# Altium footprint library IoWLabs.PcbLib: 55 footprints (part 3 of 4)
Each footprint in its own frame and in the unit in brackets; x right, y up, seen from the top. Pads: shape width x height; smd on the part's side, far side on the other; paste and mask are expansions set on the pad; w line width, h text height; cw(c..) or ccw(c..) is an arc to the next point about the centre after c.
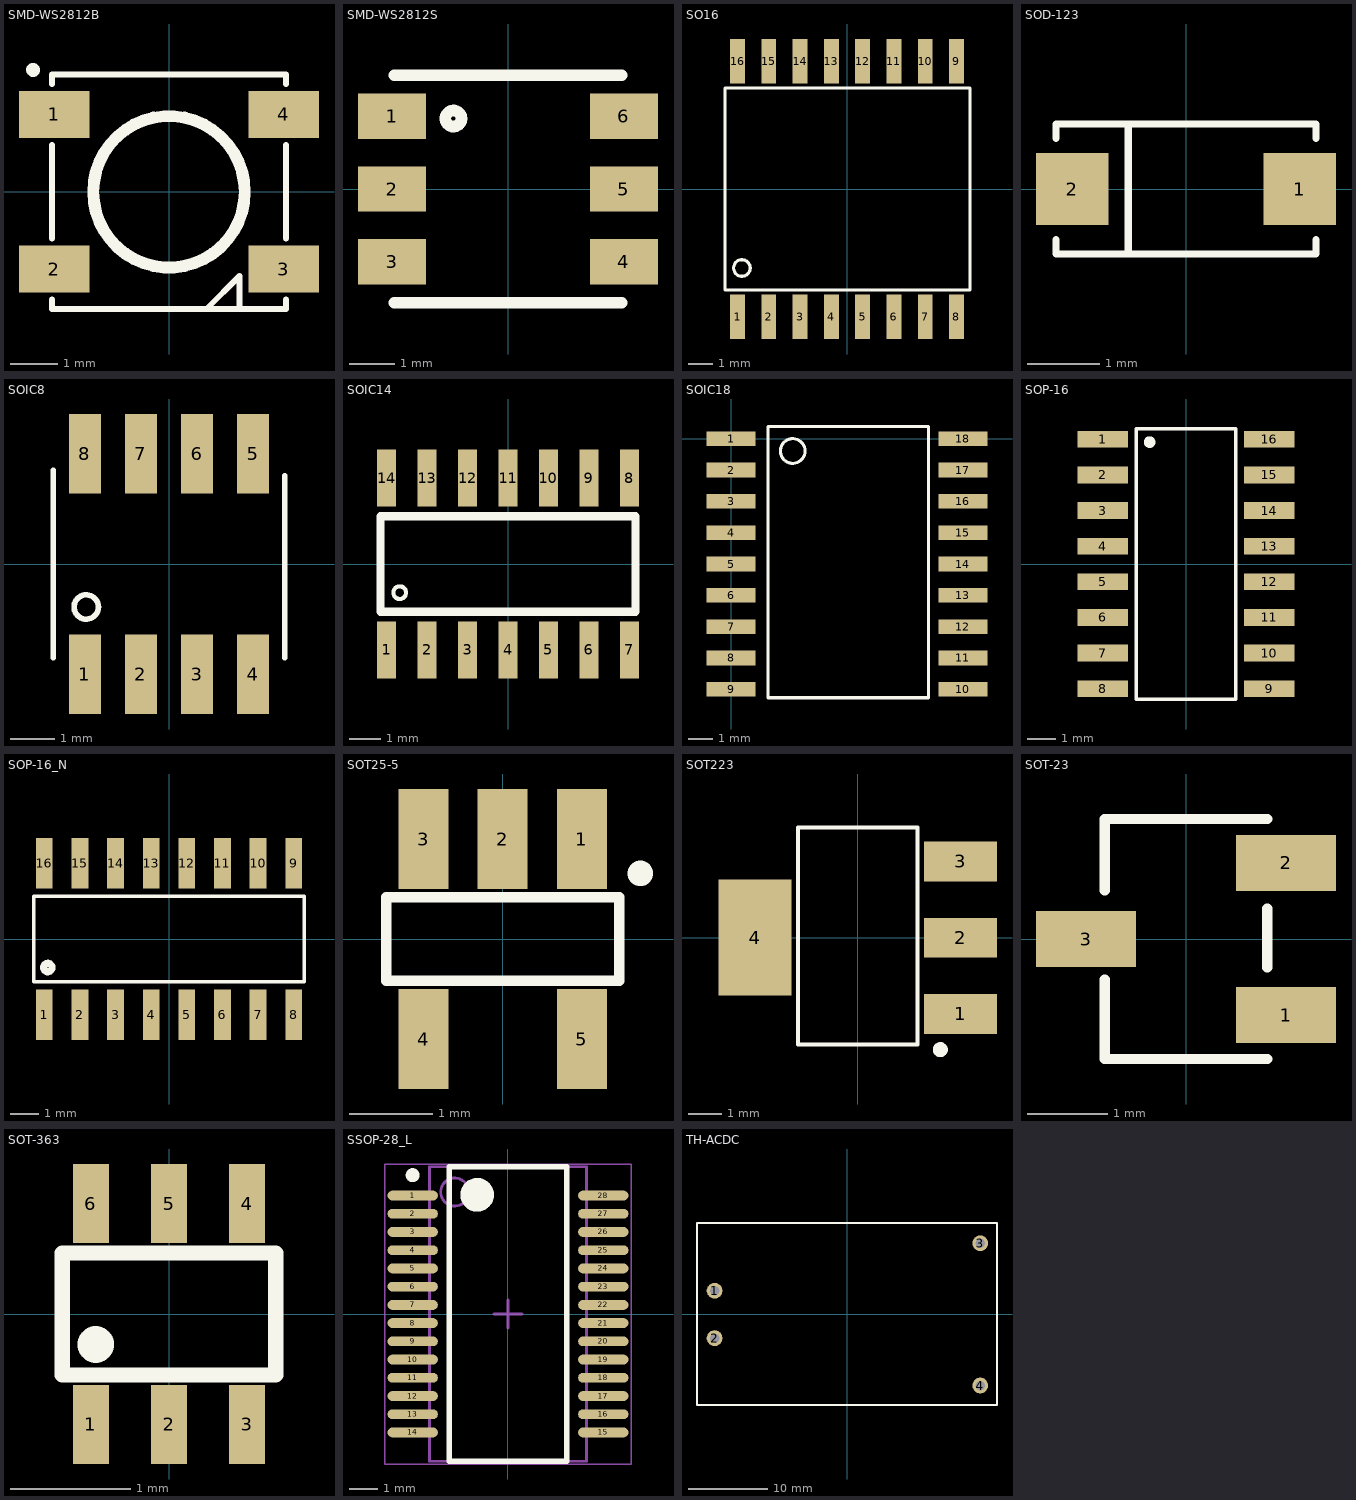
[diagram p2: the footprints below, top view; thin cyan lines are the x and y axes]

## SMD-WS2812B [mm] "SMD-WS2812B"
pads (4):
  rect 1.5x1 smd: 1(-2.45,1.65) 2(-2.45,-1.65) 3(2.45,-1.65) 4(2.45,1.65)
Top Overlay:
  circle w0.254: c0,0 r1.616
  circle w0.254: c-2.9,2.6 r0.02
  lines w0.127: -2.5,-2.3 -2.5,-2.5 2.5,-2.5 2.5,-2.3 ; -2.5,-1 -2.5,1 ; -2.5,2.3 -2.5,2.5 2.5,2.5 2.5,2.3 ; 0.8,-2.5 1.5,-1.8 ; 2.5,-1 2.5,1 ; 1.5,-1.8 1.5,-2.5 1.5,-1.8 ; 1.5,-1.8 1.5,-1.8
3D body "WS2812_RGB_LED_updated.stp": height 1.7, standoff 0, extent -2.675,-2.475 2.675,2.475

## SMD-WS2812S [mm] "SMD-WS2812S"
pads (6):
  rect 1.5x1 smd: 1(-2.55,1.6) 2(-2.55,0) 3(-2.55,-1.6) 4(2.55,-1.6) 5(2.55,0) 6(2.55,1.6)
Top Overlay:
  circle w0.254: c-1.2,1.55 r0.177
  lines w0.254: -2.5,-2.5 2.5,-2.5 ; -2.5,2.5 2.5,2.5
3D body "LED - SMD RGB (WS2812).sldprt": height 1.67, standoff -0.03, extent -2.7,-2.475 2.65,2.475

## SO16 [mm]
pads (16):
  rect 0.6x1.8 smd: 1(-4.445,-5.194) 2(-3.175,-5.194) 3(-1.905,-5.194) 4(-0.635,-5.194) 5(0.635,-5.194) 6(1.905,-5.194) 7(3.175,-5.194) 8(4.445,-5.194) 9(4.445,5.194) 10(3.175,5.194) 11(1.905,5.194) 12(0.635,5.194) 13(-0.635,5.194) 14(-1.905,5.194) 15(-3.175,5.194) 16(-4.445,5.194)
Top Overlay:
  circle w0.127: c-4.27,-3.21 r0.337
  lines w0.127: -4.95,-4.1 -4.95,4.1 5,4.1 5,-4.1 -4.95,-4.1
3D body "SO16W.STEP": height 2.54, standoff 0.01, extent -5.21,-5.292 5.1,5.252

## SOD-123 [mm]
pads (2):
  rect 1x1 smd: 1(1.575,0) 2(-1.575,0)
Top Overlay:
  lines w0.1: -1.8,-0.7 -1.8,-0.9 1.8,-0.9 1.8,-0.7 ; -1.8,0.7 -1.8,0.9 1.8,0.9 1.8,0.7 ; -0.8,-0.9 -0.8,0.9
3D body "PMDU.stp": height 0.9, standoff 0, extent -1.81,-0.85 1.81,0.85

## SOIC8 [mm]
pads (8):
  rect 0.72x1.8 smd: 1(-1.905,-2.5) 2(-0.635,-2.5) 3(0.635,-2.5) 4(1.905,-2.5) 5(1.905,2.5) 6(0.635,2.5) 7(-0.635,2.5) 8(-1.905,2.5)
Top Overlay:
  circle w0.127: c-1.875,-0.975 r0.276
  lines w0.127: -2.625,-2.125 -2.625,2.125 ; 2.625,-2.125 2.625,2
3D body "SOIC08 narrow.stp": height 2, standoff 0, extent -2.5,-3.082 2.5,3.082

## SOIC14 [mm] "SOIC14 ( D )"
pads (14):
  rect 0.6x1.8 smd: 1(-3.81,-2.7) 2(-2.54,-2.7) 3(-1.27,-2.7) 4(0,-2.7) 5(1.27,-2.7) 6(2.54,-2.7) 7(3.81,-2.7) 8(3.81,2.7) 9(2.54,2.7) 10(1.27,2.7) 11(0,2.7) 12(-1.27,2.7) 13(-2.54,2.7) 14(-3.81,2.7)
Top Overlay:
  circle w0.127: c-3.4,-0.9 r0.2
  lines w0.254: -4,-1.5 4,-1.5 4,1.5 -4,1.5 -4,-1.5
3D body "SOIC14 narrow.stp": height 2, standoff 0, extent -4.405,-3.081 4.405,3.082

## SOIC16 [mm]

## SOIC18 [mm]
pads (18):
  rect 2x0.6 smd: 1(0,0) 2(0,-1.27) 3(0,-2.54) 4(0,-3.81) 5(0,-5.08) 6(0,-6.35) 7(0,-7.62) 8(0,-8.89) 9(0,-10.16) 10(9.4,-10.16) 11(9.4,-8.89) 12(9.4,-7.62) 13(9.4,-6.35) 14(9.4,-5.08) 15(9.4,-3.81) 16(9.4,-2.54) 17(9.4,-1.27) 18(9.4,0)
Top Overlay:
  circle w0.127: c2.5,-0.5 r0.5
  lines w0.127: 1.5,-10.5 8,-10.5 8,0.5 1.5,0.5 1.5,-10.5
3D body "ULN2803--3DModel-STEP-56544.STEP": height 2.64, standoff 0, extent -0.481,-10.879 9.831,0.678

## SOP-16 [mm]
pads (16):
  rect 1.8x0.6 smd: 1(-2.972,4.445) 2(-2.972,3.175) 3(-2.972,1.905) 4(-2.972,0.635) 5(-2.972,-0.635) 6(-2.972,-1.905) 7(-2.972,-3.175) 8(-2.972,-4.445) 9(2.972,-4.445) 10(2.972,-3.175) 11(2.972,-1.905) 12(2.972,-0.635) 13(2.972,0.635) 14(2.972,1.905) 15(2.972,3.175) 16(2.972,4.445)
Top Overlay:
  circle w0.254: c-1.295,4.343 r0.08
  lines w0.127: -1.778,-4.826 1.778,-4.826 1.778,4.826 -1.778,4.826 -1.778,-4.826
3D body "SOP-16.STEP": height 2.1, standoff -0.02, extent -3.555,-5.535 3.555,5.485

## SOP-16_N [mm]
pads (16):
  rect 0.6x1.8 smd: 1(-4.445,-2.7) 2(-3.175,-2.7) 3(-1.905,-2.7) 4(-0.635,-2.7) 5(0.635,-2.7) 6(1.905,-2.7) 7(3.175,-2.7) 8(4.445,-2.7) 9(4.445,2.7) 10(3.175,2.7) 11(1.905,2.7) 12(0.635,2.7) 13(-0.635,2.7) 14(-1.905,2.7) 15(-3.175,2.7) 16(-4.445,2.7)
Top Overlay:
  circle w0.254: c-4.318,-1.016 r0.15
  lines w0.127: -4.826,-1.524 4.826,-1.524 4.826,1.524 -4.826,1.524 -4.826,-1.524
3D body "SOP-16.STEP": height 2.1, standoff -0.02, extent -5.51,-3.555 5.51,3.555

## SOT25-5 [mm]
pads (5):
  rect 0.6x1.2 smd: 1(0.95,1.2) 2(0,1.2) 3(-0.95,1.2) 4(-0.95,-1.2) 5(0.95,-1.2)
Top Overlay:
  circle w0.254: c1.651,0.787 r0.025
  lines w0.127: -1.4,-0.5 -1.4,0.5 1.4,0.5 1.4,-0.5 -1.4,-0.5
3D body "SOT25.step": height 1.45, standoff 0, extent -1.55,-1.475 1.55,1.525

## SOT223 [mm]
pads (4):
  rect 2.2x1.2 smd: 1(3.1,-2.3) 2(3.1,0) 3(3.1,2.3)
  rect 2.2x3.5 smd: 4(-3.1,0)
Top Overlay:
  circle w0.254: c2.489,-3.378 r0.1
  lines w0.127: -1.8,-3.226 -1.8,3.327 1.8,3.327 1.8,-3.226 -1.8,-3.226
3D body "SOT223-3.step": height 1.6, standoff 0, extent -3.48,-3.213 3.594,3.287

## SOT-23 [mm] "SOT-23"
pads (3):
  rect 1.25x0.7 smd: 1(1.25,-0.95) 2(1.25,0.95) 3(-1.25,0)
Top Overlay:
  lines w0.127: -1.016,-0.508 -1.016,-1.499 1.016,-1.499 ; -1.016,0.61 -1.016,1.499 1.016,1.499 ; 1.016,-0.356 1.016,0.381
3D body "SOT23-3.stp": height 1.2, standoff 0.02, extent -1.418,-1.5 1.418,1.5

## SOT-363 [mm]
pads (6):
  rect 0.3x0.66 smd: 1(-0.65,-0.92) 2(0,-0.92) 3(0.65,-0.92) 4(0.65,0.92) 5(0,0.92) 6(-0.65,0.92)
Top Overlay:
  circle w0.254: c-0.61,-0.254 r0.025
  lines w0.127: -0.889,-0.508 -0.889,0.508 0.889,0.508 0.889,-0.508 -0.889,-0.508
3D body "SOT-363.STEP": height 1.1, standoff 0, extent -1.1,-1.1 1.1,1.1

## SSOP-28_L [mm] "SOP, 28-Leads, Body 10.2x5.3mm, Pitch 0.65mm, IPC High Density"
height 2
pads (28):
  oval 1.8x0.35 smd: 1(-3.4,4.225) 2(-3.4,3.575) 3(-3.4,2.925) 4(-3.4,2.275) 5(-3.4,1.625) 6(-3.4,0.975) 7(-3.4,0.325) 8(-3.4,-0.325) 9(-3.4,-0.975) 10(-3.4,-1.625) 11(-3.4,-2.275) 12(-3.4,-2.925) 13(-3.4,-3.575) 14(-3.4,-4.225) 15(3.4,-4.225) 16(3.4,-3.575) 17(3.4,-2.925) 18(3.4,-2.275) 19(3.4,-1.625) 20(3.4,-0.975) 21(3.4,-0.325) 22(3.4,0.325) 23(3.4,0.975) 24(3.4,1.625) 25(3.4,2.275) 26(3.4,2.925) 27(3.4,3.575) 28(3.4,4.225)
Top Overlay:
  circle w0.25: c-3.4,4.95 r0.125
  circle w0.6: c-1.1,4.25 r0.3
  lines w0.2: -2.1,-5.25 -2.1,5.25 2.1,5.25 2.1,-5.25 -2.1,-5.25
Mechanical 13:
  circle w0.1: c-1.9,4.35 r0.5
  lines w0.1: -2.8,-5.25 -2.8,5.25 2.8,5.25 2.8,-5.25 -2.8,-5.25
Mechanical 15:
  lines w0.05: -4.4,-5.35 -4.4,5.35 4.4,5.35 4.4,-5.35 -4.4,-5.35
  lines w0.1: -0.5,0 0.5,0 ; 0,-0.5 0,0.5
3D body: height 2, standoff 0.05, extent -2.8,-5.25 2.8,5.25

## TH-ACDC [mm] "hi link ac dc module"
pads (4):
  round 2 hole 1.2: 1(-16.8,3) 2(-16.8,-3) 3(16.8,9) 4(16.8,-9)
Top Overlay:
  lines w0.254: -19.025,-11.43 18.923,-11.43 18.923,11.506 18.898,11.532 -19.025,11.532 -19.025,-11.43
3D body "HLK-5M05.stp": height 18.01, standoff -3.1, extent -19.025,-11.449 18.975,11.551